# Altium footprint library Connector_PinHeader_1.27mm.PcbLib: 278 footprints (part 4 of 18)
Each footprint in its own frame and in the unit in brackets; x right, y up, seen from the top. Pads: shape width x height; smd on the part's side, far side on the other; paste and mask are expansions set on the pad; w line width, h text height; cw(c..) or ccw(c..) is an arc to the next point about the centre after c.
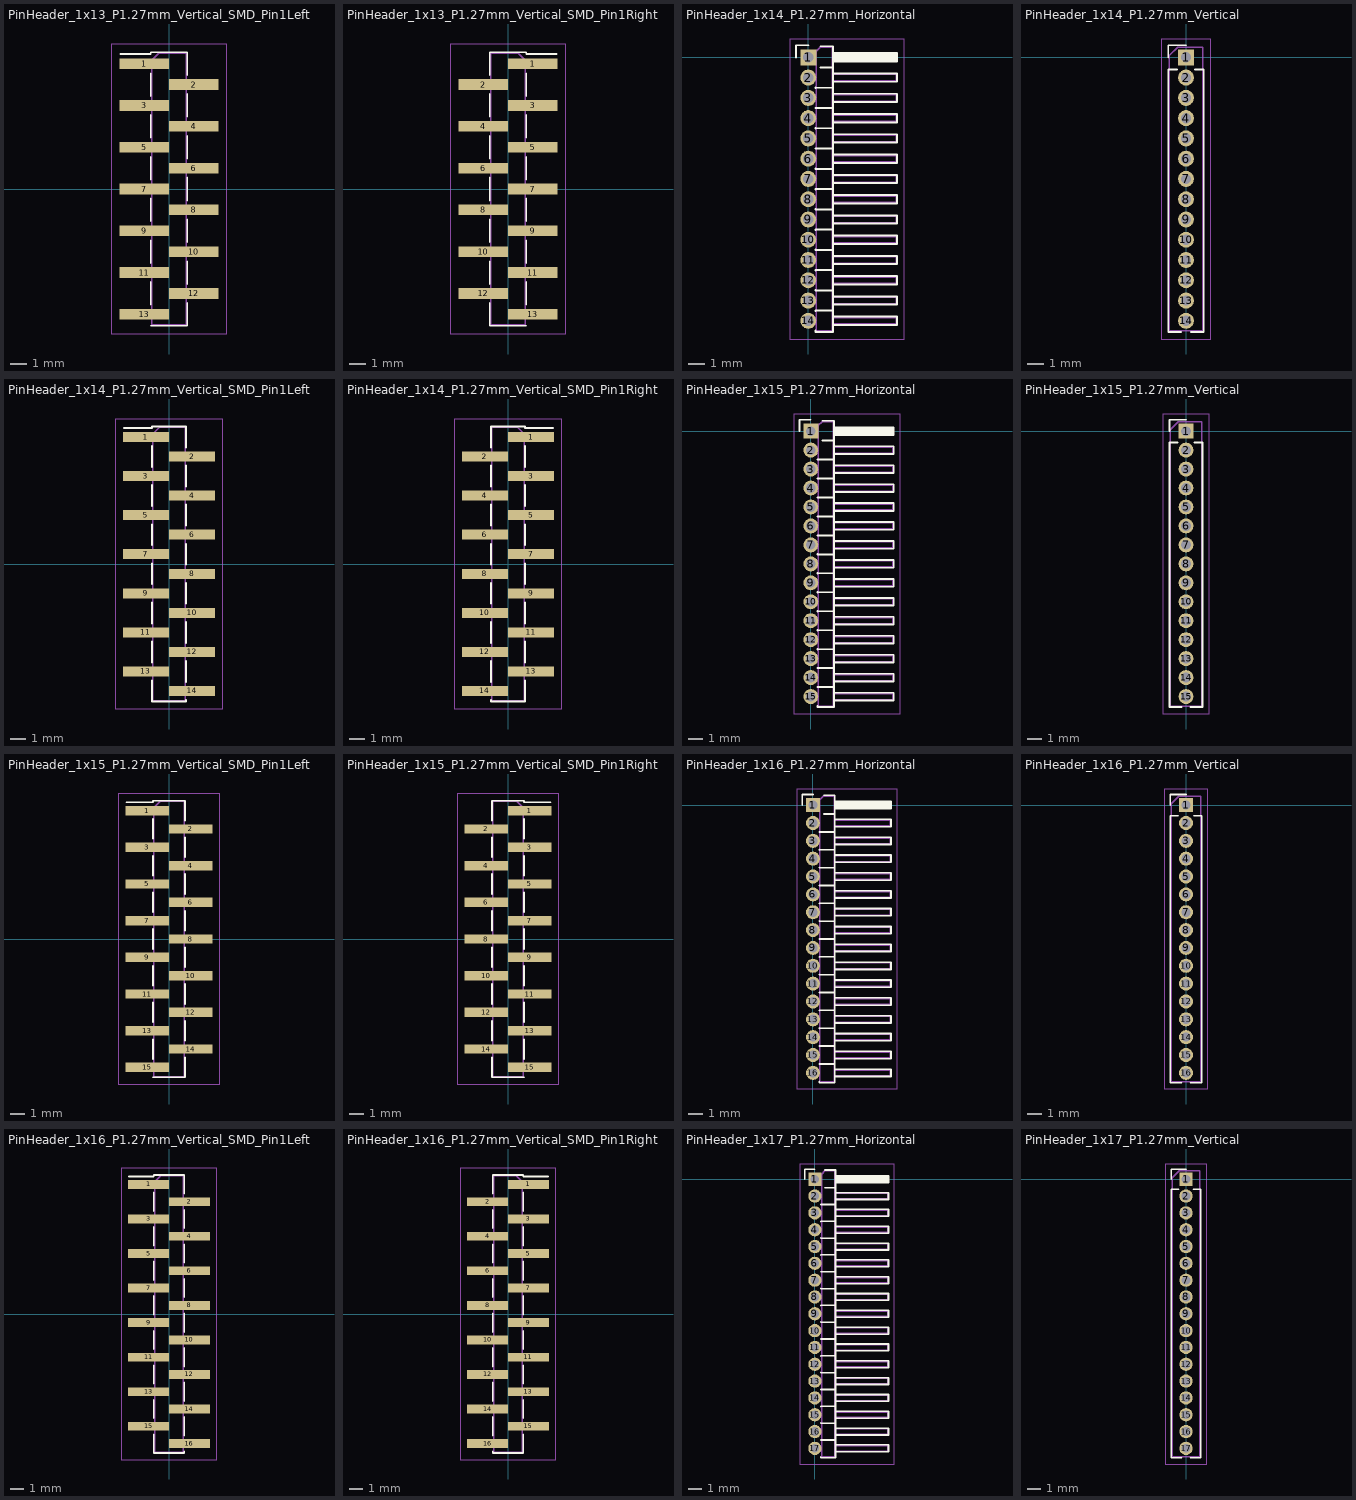
[diagram p3: the footprints below, top view; thin cyan lines are the x and y axes]

## PinHeader_1x13_P1.27mm_Vertical_SMD_Pin1Left [mm]
pads (13):
  rect 3x0.65 smd: 1(-1.5,7.62) 2(1.5,6.35) 3(-1.5,5.08) 4(1.5,3.81) 5(-1.5,2.54) 6(1.5,1.27) 7(-1.5,0) 8(1.5,-1.27) 9(-1.5,-2.54) 10(1.5,-3.81) 11(-1.5,-5.08) 12(1.5,-6.35) 13(-1.5,-7.62)
F.SilkS:
  lines w0.12: -2.94,8.205 -1.11,8.205 -1.11,8.315 1.11,8.315 ; -1.11,-8.315 1.11,-8.315 1.11,-8.205 ; -1.11,-7.035 -1.11,-5.665 ; -1.11,-4.495 -1.11,-3.125 ; -1.11,-1.955 -1.11,-0.585 ; -1.11,0.585 -1.11,1.955 ; -1.11,3.125 -1.11,4.495 ; -1.11,5.665 -1.11,7.035 ; 1.11,-8.305 1.11,-6.935 ; 1.11,-5.765 1.11,-4.395 ; 1.11,-3.225 1.11,-1.855 ; 1.11,-0.685 1.11,0.685 ; 1.11,1.855 1.11,3.225 ; 1.11,4.395 1.11,5.765 ; 1.11,6.935 1.11,8.305
F.CrtYd:
  lines w0.05: -3.5,-8.8 -3.5,8.8 3.5,8.8 3.5,-8.8 -3.5,-8.8
F.Fab:
  lines w0.1: -1.05,-7.82 -2.5,-7.82 -2.5,-7.42 -1.05,-7.42 ; -1.05,-5.28 -2.5,-5.28 -2.5,-4.88 -1.05,-4.88 ; -1.05,-2.74 -2.5,-2.74 -2.5,-2.34 -1.05,-2.34 ; -1.05,-0.2 -2.5,-0.2 -2.5,0.2 -1.05,0.2 ; -1.05,2.34 -2.5,2.34 -2.5,2.74 -1.05,2.74 ; -1.05,4.88 -2.5,4.88 -2.5,5.28 -1.05,5.28 ; -1.05,7.42 -2.5,7.42 -2.5,7.82 -1.05,7.82 ; 1.05,-6.55 2.5,-6.55 2.5,-6.15 1.05,-6.15 ; 1.05,-4.01 2.5,-4.01 2.5,-3.61 1.05,-3.61 ; 1.05,-1.47 2.5,-1.47 2.5,-1.07 1.05,-1.07 ; 1.05,1.07 2.5,1.07 2.5,1.47 1.05,1.47 ; 1.05,3.61 2.5,3.61 2.5,4.01 1.05,4.01 ; 1.05,6.15 2.5,6.15 2.5,6.55 1.05,6.55 ; -1.05,7.82 -1.05,-8.255 1.05,-8.255 1.05,8.255 -0.615,8.255 -1.05,7.82
  text "'.Designator'" at 0.84,-4.047 h1

## PinHeader_1x13_P1.27mm_Vertical_SMD_Pin1Right [mm]
pads (13):
  rect 3x0.65 smd: 1(1.5,7.62) 2(-1.5,6.35) 3(1.5,5.08) 4(-1.5,3.81) 5(1.5,2.54) 6(-1.5,1.27) 7(1.5,0) 8(-1.5,-1.27) 9(1.5,-2.54) 10(-1.5,-3.81) 11(1.5,-5.08) 12(-1.5,-6.35) 13(1.5,-7.62)
F.SilkS:
  lines w0.12: -1.11,-8.305 -1.11,-6.935 ; -1.11,-8.205 -1.11,-8.315 1.11,-8.315 ; -1.11,-5.765 -1.11,-4.395 ; -1.11,-3.225 -1.11,-1.855 ; -1.11,-0.685 -1.11,0.685 ; -1.11,1.855 -1.11,3.225 ; -1.11,4.395 -1.11,5.765 ; -1.11,6.935 -1.11,8.305 ; -1.11,8.315 1.11,8.315 1.11,8.205 2.94,8.205 ; 1.11,-7.035 1.11,-5.665 ; 1.11,-4.495 1.11,-3.125 ; 1.11,-1.955 1.11,-0.585 ; 1.11,0.585 1.11,1.955 ; 1.11,3.125 1.11,4.495 ; 1.11,5.665 1.11,7.035
F.CrtYd:
  lines w0.05: -3.5,-8.8 3.5,-8.8 3.5,8.8 -3.5,8.8 -3.5,-8.8
F.Fab:
  lines w0.1: -1.05,-6.55 -2.5,-6.55 -2.5,-6.15 -1.05,-6.15 ; -1.05,-4.01 -2.5,-4.01 -2.5,-3.61 -1.05,-3.61 ; -1.05,-1.47 -2.5,-1.47 -2.5,-1.07 -1.05,-1.07 ; -1.05,1.07 -2.5,1.07 -2.5,1.47 -1.05,1.47 ; -1.05,3.61 -2.5,3.61 -2.5,4.01 -1.05,4.01 ; -1.05,6.15 -2.5,6.15 -2.5,6.55 -1.05,6.55 ; 1.05,-7.82 2.5,-7.82 2.5,-7.42 1.05,-7.42 ; 1.05,-5.28 2.5,-5.28 2.5,-4.88 1.05,-4.88 ; 1.05,-2.74 2.5,-2.74 2.5,-2.34 1.05,-2.34 ; 1.05,-0.2 2.5,-0.2 2.5,0.2 1.05,0.2 ; 1.05,2.34 2.5,2.34 2.5,2.74 1.05,2.74 ; 1.05,4.88 2.5,4.88 2.5,5.28 1.05,5.28 ; 1.05,7.42 2.5,7.42 2.5,7.82 1.05,7.82 ; 1.05,7.82 1.05,-8.255 -1.05,-8.255 -1.05,8.255 0.615,8.255 1.05,7.82
  text "'.Designator'" at 0.84,-4.047 h1

## PinHeader_1x14_P1.27mm_Horizontal [mm]
pads (14):
  rect 1x1 hole 0.65: 1(0,0)
  rrect100% 1x1 hole 0.65: 2(0,-1.27) 3(0,-2.54) 4(0,-3.81) 5(0,-5.08) 6(0,-6.35) 7(0,-7.62) 8(0,-8.89) 9(0,-10.16) 10(0,-11.43) 11(0,-12.7) 12(0,-13.97) 13(0,-15.24) 14(0,-16.51)
F.SilkS:
  lines w0.12: -0.76,0 -0.76,0.76 0,0.76 ; 0.44,-17.13 0.44,-17.205 1.56,-17.205 1.56,0.695 0.76,0.695 ; 0.44,-15.89 0.44,-15.86 ; 0.44,-15.875 1.56,-15.875 ; 0.44,-14.62 0.44,-14.59 ; 0.44,-14.605 1.56,-14.605 ; 0.44,-13.35 0.44,-13.32 ; 0.44,-13.335 1.56,-13.335 ; 0.44,-12.08 0.44,-12.05 ; 0.44,-12.065 1.56,-12.065 ; 0.44,-10.81 0.44,-10.78 ; 0.44,-10.795 1.56,-10.795 ; 0.44,-9.54 0.44,-9.51 ; 0.44,-9.525 1.56,-9.525 ; 0.44,-8.27 0.44,-8.24 ; 0.44,-8.255 1.56,-8.255 ; 0.44,-7 0.44,-6.97 ; 0.44,-6.985 1.56,-6.985 ; 0.44,-5.73 0.44,-5.7 ; 0.44,-5.715 1.56,-5.715 ; 0.44,-4.46 0.44,-4.43 ; 0.44,-4.445 1.56,-4.445 ; 0.44,-3.19 0.44,-3.16 ; 0.44,-3.175 1.56,-3.175 ; 0.44,-1.92 0.44,-1.89 ; 0.44,-1.905 1.56,-1.905 ; 0.76,-0.635 1.56,-0.635 ; 1.56,-16.77 5.56,-16.77 5.56,-16.25 1.56,-16.25 ; 1.56,-15.5 5.56,-15.5 5.56,-14.98 1.56,-14.98 ; 1.56,-14.23 5.56,-14.23 5.56,-13.71 1.56,-13.71 ; 1.56,-12.96 5.56,-12.96 5.56,-12.44 1.56,-12.44 ; 1.56,-11.69 5.56,-11.69 5.56,-11.17 1.56,-11.17 ; 1.56,-10.42 5.56,-10.42 5.56,-9.9 1.56,-9.9 ; 1.56,-9.15 5.56,-9.15 5.56,-8.63 1.56,-8.63 ; 1.56,-7.88 5.56,-7.88 5.56,-7.36 1.56,-7.36 ; 1.56,-6.61 5.56,-6.61 5.56,-6.09 1.56,-6.09 ; 1.56,-5.34 5.56,-5.34 5.56,-4.82 1.56,-4.82 ; 1.56,-4.07 5.56,-4.07 5.56,-3.55 1.56,-3.55 ; 1.56,-2.8 5.56,-2.8 5.56,-2.28 1.56,-2.28 ; 1.56,-1.53 5.56,-1.53 5.56,-1.01 1.56,-1.01 ; 1.56,-0.26 5.56,-0.26 5.56,0.26 1.56,0.26 ; 1.56,-0.16 5.56,-0.16 ; 1.56,-0.04 5.56,-0.04 ; 1.56,0.08 5.56,0.08 ; 1.56,0.2 5.56,0.2
F.CrtYd:
  lines w0.05: -1.15,-17.65 -1.15,1.15 6,1.15 6,-17.65 -1.15,-17.65
F.Fab:
  lines w0.1: 0.5,-16.71 -0.2,-16.71 -0.2,-16.31 0.5,-16.31 ; 0.5,-15.44 -0.2,-15.44 -0.2,-15.04 0.5,-15.04 ; 0.5,-14.17 -0.2,-14.17 -0.2,-13.77 0.5,-13.77 ; 0.5,-12.9 -0.2,-12.9 -0.2,-12.5 0.5,-12.5 ; 0.5,-11.63 -0.2,-11.63 -0.2,-11.23 0.5,-11.23 ; 0.5,-10.36 -0.2,-10.36 -0.2,-9.96 0.5,-9.96 ; 0.5,-9.09 -0.2,-9.09 -0.2,-8.69 0.5,-8.69 ; 0.5,-7.82 -0.2,-7.82 -0.2,-7.42 0.5,-7.42 ; 0.5,-6.55 -0.2,-6.55 -0.2,-6.15 0.5,-6.15 ; 0.5,-5.28 -0.2,-5.28 -0.2,-4.88 0.5,-4.88 ; 0.5,-4.01 -0.2,-4.01 -0.2,-3.61 0.5,-3.61 ; 0.5,-2.74 -0.2,-2.74 -0.2,-2.34 0.5,-2.34 ; 0.5,-1.47 -0.2,-1.47 -0.2,-1.07 0.5,-1.07 ; 0.5,-0.2 -0.2,-0.2 -0.2,0.2 0.5,0.2 ; 1.5,-16.71 5.5,-16.71 5.5,-16.31 1.5,-16.31 ; 1.5,-15.44 5.5,-15.44 5.5,-15.04 1.5,-15.04 ; 1.5,-14.17 5.5,-14.17 5.5,-13.77 1.5,-13.77 ; 1.5,-12.9 5.5,-12.9 5.5,-12.5 1.5,-12.5 ; 1.5,-11.63 5.5,-11.63 5.5,-11.23 1.5,-11.23 ; 1.5,-10.36 5.5,-10.36 5.5,-9.96 1.5,-9.96 ; 1.5,-9.09 5.5,-9.09 5.5,-8.69 1.5,-8.69 ; 1.5,-7.82 5.5,-7.82 5.5,-7.42 1.5,-7.42 ; 1.5,-6.55 5.5,-6.55 5.5,-6.15 1.5,-6.15 ; 1.5,-5.28 5.5,-5.28 5.5,-4.88 1.5,-4.88 ; 1.5,-4.01 5.5,-4.01 5.5,-3.61 1.5,-3.61 ; 1.5,-2.74 5.5,-2.74 5.5,-2.34 1.5,-2.34 ; 1.5,-1.47 5.5,-1.47 5.5,-1.07 1.5,-1.07 ; 1.5,-0.2 5.5,-0.2 5.5,0.2 1.5,0.2 ; 0.5,-17.145 1.5,-17.145 1.5,0.635 0.75,0.635 0.5,0.385 0.5,-17.145
  text "'.Designator'" at 1.504,-10.683 h0.6

## PinHeader_1x14_P1.27mm_Vertical [mm]
pads (14):
  rect 1x1 hole 0.65: 1(0,0)
  rrect100% 1x1 hole 0.65: 2(0,-1.27) 3(0,-2.54) 4(0,-3.81) 5(0,-5.08) 6(0,-6.35) 7(0,-7.62) 8(0,-8.89) 9(0,-10.16) 10(0,-11.43) 11(0,-12.7) 12(0,-13.97) 13(0,-15.24) 14(0,-16.51)
F.SilkS:
  lines w0.12: -1.11,0 -1.11,0.76 0,0.76 ; -0.563,-0.76 -1.11,-0.76 -1.11,-17.205 -0.308,-17.205 ; 0.308,-17.205 1.11,-17.205 1.11,-0.76 0.563,-0.76
F.CrtYd:
  lines w0.05: -1.55,-17.65 1.55,-17.65 1.55,1.15 -1.55,1.15 -1.55,-17.65
F.Fab:
  lines w0.1: -1.05,-17.145 1.05,-17.145 1.05,0.635 -0.525,0.635 -1.05,0.11 -1.05,-17.145
  text "'.Designator'" at 0.84,-12.302 h1

## PinHeader_1x14_P1.27mm_Vertical_SMD_Pin1Left [mm]
pads (14):
  rect 3x0.65 smd: 1(-1.5,8.255) 2(1.5,6.985) 3(-1.5,5.715) 4(1.5,4.445) 5(-1.5,3.175) 6(1.5,1.905) 7(-1.5,0.635) 8(1.5,-0.635) 9(-1.5,-1.905) 10(1.5,-3.175) 11(-1.5,-4.445) 12(1.5,-5.715) 13(-1.5,-6.985) 14(1.5,-8.255)
F.SilkS:
  lines w0.12: -2.94,8.84 -1.11,8.84 -1.11,8.95 1.11,8.95 ; -1.11,-8.95 1.11,-8.95 1.11,-8.84 ; -1.11,-8.94 -1.11,-7.57 ; -1.11,-6.4 -1.11,-5.03 ; -1.11,-3.86 -1.11,-2.49 ; -1.11,-1.32 -1.11,0.05 ; -1.11,1.22 -1.11,2.59 ; -1.11,3.76 -1.11,5.13 ; -1.11,6.3 -1.11,7.67 ; 1.11,-7.67 1.11,-6.3 ; 1.11,-5.13 1.11,-3.76 ; 1.11,-2.59 1.11,-1.22 ; 1.11,-0.05 1.11,1.32 ; 1.11,2.49 1.11,3.86 ; 1.11,5.03 1.11,6.4 ; 1.11,7.57 1.11,8.94
F.CrtYd:
  lines w0.05: -3.5,-9.4 -3.5,9.4 3.5,9.4 3.5,-9.4 -3.5,-9.4
F.Fab:
  lines w0.1: -1.05,-7.185 -2.5,-7.185 -2.5,-6.785 -1.05,-6.785 ; -1.05,-4.645 -2.5,-4.645 -2.5,-4.245 -1.05,-4.245 ; -1.05,-2.105 -2.5,-2.105 -2.5,-1.705 -1.05,-1.705 ; -1.05,0.435 -2.5,0.435 -2.5,0.835 -1.05,0.835 ; -1.05,2.975 -2.5,2.975 -2.5,3.375 -1.05,3.375 ; -1.05,5.515 -2.5,5.515 -2.5,5.915 -1.05,5.915 ; -1.05,8.055 -2.5,8.055 -2.5,8.455 -1.05,8.455 ; 1.05,-8.455 2.5,-8.455 2.5,-8.055 1.05,-8.055 ; 1.05,-5.915 2.5,-5.915 2.5,-5.515 1.05,-5.515 ; 1.05,-3.375 2.5,-3.375 2.5,-2.975 1.05,-2.975 ; 1.05,-0.835 2.5,-0.835 2.5,-0.435 1.05,-0.435 ; 1.05,1.705 2.5,1.705 2.5,2.105 1.05,2.105 ; 1.05,4.245 2.5,4.245 2.5,4.645 1.05,4.645 ; 1.05,6.785 2.5,6.785 2.5,7.185 1.05,7.185 ; -1.05,8.455 -0.615,8.89 1.05,8.89 1.05,-8.89 -1.05,-8.89 -1.05,8.455
  text "'.Designator'" at 0.84,-4.047 h1

## PinHeader_1x14_P1.27mm_Vertical_SMD_Pin1Right [mm]
pads (14):
  rect 3x0.65 smd: 1(1.5,8.255) 2(-1.5,6.985) 3(1.5,5.715) 4(-1.5,4.445) 5(1.5,3.175) 6(-1.5,1.905) 7(1.5,0.635) 8(-1.5,-0.635) 9(1.5,-1.905) 10(-1.5,-3.175) 11(1.5,-4.445) 12(-1.5,-5.715) 13(1.5,-6.985) 14(-1.5,-8.255)
F.SilkS:
  lines w0.12: -1.11,-8.84 -1.11,-8.95 1.11,-8.95 ; -1.11,-7.67 -1.11,-6.3 ; -1.11,-5.13 -1.11,-3.76 ; -1.11,-2.59 -1.11,-1.22 ; -1.11,-0.05 -1.11,1.32 ; -1.11,2.49 -1.11,3.86 ; -1.11,5.03 -1.11,6.4 ; -1.11,7.57 -1.11,8.94 ; -1.11,8.95 1.11,8.95 1.11,8.84 2.94,8.84 ; 1.11,-8.94 1.11,-7.57 ; 1.11,-6.4 1.11,-5.03 ; 1.11,-3.86 1.11,-2.49 ; 1.11,-1.32 1.11,0.05 ; 1.11,1.22 1.11,2.59 ; 1.11,3.76 1.11,5.13 ; 1.11,6.3 1.11,7.67
F.CrtYd:
  lines w0.05: -3.5,-9.4 3.5,-9.4 3.5,9.4 -3.5,9.4 -3.5,-9.4
F.Fab:
  lines w0.1: -1.05,-8.455 -2.5,-8.455 -2.5,-8.055 -1.05,-8.055 ; -1.05,-5.915 -2.5,-5.915 -2.5,-5.515 -1.05,-5.515 ; -1.05,-3.375 -2.5,-3.375 -2.5,-2.975 -1.05,-2.975 ; -1.05,-0.835 -2.5,-0.835 -2.5,-0.435 -1.05,-0.435 ; -1.05,1.705 -2.5,1.705 -2.5,2.105 -1.05,2.105 ; -1.05,4.245 -2.5,4.245 -2.5,4.645 -1.05,4.645 ; -1.05,6.785 -2.5,6.785 -2.5,7.185 -1.05,7.185 ; 1.05,-7.185 2.5,-7.185 2.5,-6.785 1.05,-6.785 ; 1.05,-4.645 2.5,-4.645 2.5,-4.245 1.05,-4.245 ; 1.05,-2.105 2.5,-2.105 2.5,-1.705 1.05,-1.705 ; 1.05,0.435 2.5,0.435 2.5,0.835 1.05,0.835 ; 1.05,2.975 2.5,2.975 2.5,3.375 1.05,3.375 ; 1.05,5.515 2.5,5.515 2.5,5.915 1.05,5.915 ; 1.05,8.055 2.5,8.055 2.5,8.455 1.05,8.455 ; 1.05,8.455 1.05,-8.89 -1.05,-8.89 -1.05,8.89 0.615,8.89 1.05,8.455
  text "'.Designator'" at 0.84,-4.047 h1

## PinHeader_1x15_P1.27mm_Horizontal [mm]
pads (15):
  rect 1x1 hole 0.65: 1(0,0)
  rrect100% 1x1 hole 0.65: 2(0,-1.27) 3(0,-2.54) 4(0,-3.81) 5(0,-5.08) 6(0,-6.35) 7(0,-7.62) 8(0,-8.89) 9(0,-10.16) 10(0,-11.43) 11(0,-12.7) 12(0,-13.97) 13(0,-15.24) 14(0,-16.51) 15(0,-17.78)
F.SilkS:
  lines w0.12: -0.76,0 -0.76,0.76 0,0.76 ; 0.44,-18.4 0.44,-18.475 1.56,-18.475 1.56,0.695 0.76,0.695 ; 0.44,-17.16 0.44,-17.13 ; 0.44,-17.145 1.56,-17.145 ; 0.44,-15.89 0.44,-15.86 ; 0.44,-15.875 1.56,-15.875 ; 0.44,-14.62 0.44,-14.59 ; 0.44,-14.605 1.56,-14.605 ; 0.44,-13.35 0.44,-13.32 ; 0.44,-13.335 1.56,-13.335 ; 0.44,-12.08 0.44,-12.05 ; 0.44,-12.065 1.56,-12.065 ; 0.44,-10.81 0.44,-10.78 ; 0.44,-10.795 1.56,-10.795 ; 0.44,-9.54 0.44,-9.51 ; 0.44,-9.525 1.56,-9.525 ; 0.44,-8.27 0.44,-8.24 ; 0.44,-8.255 1.56,-8.255 ; 0.44,-7 0.44,-6.97 ; 0.44,-6.985 1.56,-6.985 ; 0.44,-5.73 0.44,-5.7 ; 0.44,-5.715 1.56,-5.715 ; 0.44,-4.46 0.44,-4.43 ; 0.44,-4.445 1.56,-4.445 ; 0.44,-3.19 0.44,-3.16 ; 0.44,-3.175 1.56,-3.175 ; 0.44,-1.92 0.44,-1.89 ; 0.44,-1.905 1.56,-1.905 ; 0.76,-0.635 1.56,-0.635 ; 1.56,-18.04 5.56,-18.04 5.56,-17.52 1.56,-17.52 ; 1.56,-16.77 5.56,-16.77 5.56,-16.25 1.56,-16.25 ; 1.56,-15.5 5.56,-15.5 5.56,-14.98 1.56,-14.98 ; 1.56,-14.23 5.56,-14.23 5.56,-13.71 1.56,-13.71 ; 1.56,-12.96 5.56,-12.96 5.56,-12.44 1.56,-12.44 ; 1.56,-11.69 5.56,-11.69 5.56,-11.17 1.56,-11.17 ; 1.56,-10.42 5.56,-10.42 5.56,-9.9 1.56,-9.9 ; 1.56,-9.15 5.56,-9.15 5.56,-8.63 1.56,-8.63 ; 1.56,-7.88 5.56,-7.88 5.56,-7.36 1.56,-7.36 ; 1.56,-6.61 5.56,-6.61 5.56,-6.09 1.56,-6.09 ; 1.56,-5.34 5.56,-5.34 5.56,-4.82 1.56,-4.82 ; 1.56,-4.07 5.56,-4.07 5.56,-3.55 1.56,-3.55 ; 1.56,-2.8 5.56,-2.8 5.56,-2.28 1.56,-2.28 ; 1.56,-1.53 5.56,-1.53 5.56,-1.01 1.56,-1.01 ; 1.56,-0.26 5.56,-0.26 5.56,0.26 1.56,0.26 ; 1.56,-0.16 5.56,-0.16 ; 1.56,-0.04 5.56,-0.04 ; 1.56,0.08 5.56,0.08 ; 1.56,0.2 5.56,0.2
F.CrtYd:
  lines w0.05: -1.15,-18.95 -1.15,1.15 6,1.15 6,-18.95 -1.15,-18.95
F.Fab:
  lines w0.1: 0.5,-17.98 -0.2,-17.98 -0.2,-17.58 0.5,-17.58 ; 0.5,-16.71 -0.2,-16.71 -0.2,-16.31 0.5,-16.31 ; 0.5,-15.44 -0.2,-15.44 -0.2,-15.04 0.5,-15.04 ; 0.5,-14.17 -0.2,-14.17 -0.2,-13.77 0.5,-13.77 ; 0.5,-12.9 -0.2,-12.9 -0.2,-12.5 0.5,-12.5 ; 0.5,-11.63 -0.2,-11.63 -0.2,-11.23 0.5,-11.23 ; 0.5,-10.36 -0.2,-10.36 -0.2,-9.96 0.5,-9.96 ; 0.5,-9.09 -0.2,-9.09 -0.2,-8.69 0.5,-8.69 ; 0.5,-7.82 -0.2,-7.82 -0.2,-7.42 0.5,-7.42 ; 0.5,-6.55 -0.2,-6.55 -0.2,-6.15 0.5,-6.15 ; 0.5,-5.28 -0.2,-5.28 -0.2,-4.88 0.5,-4.88 ; 0.5,-4.01 -0.2,-4.01 -0.2,-3.61 0.5,-3.61 ; 0.5,-2.74 -0.2,-2.74 -0.2,-2.34 0.5,-2.34 ; 0.5,-1.47 -0.2,-1.47 -0.2,-1.07 0.5,-1.07 ; 0.5,-0.2 -0.2,-0.2 -0.2,0.2 0.5,0.2 ; 1.5,-17.98 5.5,-17.98 5.5,-17.58 1.5,-17.58 ; 1.5,-16.71 5.5,-16.71 5.5,-16.31 1.5,-16.31 ; 1.5,-15.44 5.5,-15.44 5.5,-15.04 1.5,-15.04 ; 1.5,-14.17 5.5,-14.17 5.5,-13.77 1.5,-13.77 ; 1.5,-12.9 5.5,-12.9 5.5,-12.5 1.5,-12.5 ; 1.5,-11.63 5.5,-11.63 5.5,-11.23 1.5,-11.23 ; 1.5,-10.36 5.5,-10.36 5.5,-9.96 1.5,-9.96 ; 1.5,-9.09 5.5,-9.09 5.5,-8.69 1.5,-8.69 ; 1.5,-7.82 5.5,-7.82 5.5,-7.42 1.5,-7.42 ; 1.5,-6.55 5.5,-6.55 5.5,-6.15 1.5,-6.15 ; 1.5,-5.28 5.5,-5.28 5.5,-4.88 1.5,-4.88 ; 1.5,-4.01 5.5,-4.01 5.5,-3.61 1.5,-3.61 ; 1.5,-2.74 5.5,-2.74 5.5,-2.34 1.5,-2.34 ; 1.5,-1.47 5.5,-1.47 5.5,-1.07 1.5,-1.07 ; 1.5,-0.2 5.5,-0.2 5.5,0.2 1.5,0.2 ; 0.5,-18.415 0.5,0.385 0.75,0.635 1.5,0.635 1.5,-18.415 0.5,-18.415
  text "'.Designator'" at 1.504,-11.318 h0.6

## PinHeader_1x15_P1.27mm_Vertical [mm]
pads (15):
  rect 1x1 hole 0.65: 1(0,0)
  rrect100% 1x1 hole 0.65: 2(0,-1.27) 3(0,-2.54) 4(0,-3.81) 5(0,-5.08) 6(0,-6.35) 7(0,-7.62) 8(0,-8.89) 9(0,-10.16) 10(0,-11.43) 11(0,-12.7) 12(0,-13.97) 13(0,-15.24) 14(0,-16.51) 15(0,-17.78)
F.SilkS:
  lines w0.12: -1.11,0 -1.11,0.76 0,0.76 ; -0.563,-0.76 -1.11,-0.76 -1.11,-18.475 -0.308,-18.475 ; 0.308,-18.475 1.11,-18.475 1.11,-0.76 0.563,-0.76
F.CrtYd:
  lines w0.05: -1.55,-18.95 -1.55,1.15 1.55,1.15 1.55,-18.95 -1.55,-18.95
F.Fab:
  lines w0.1: -1.05,-18.415 -1.05,0.11 -0.525,0.635 1.05,0.635 1.05,-18.415 -1.05,-18.415
  text "'.Designator'" at 0.84,-12.937 h1

## PinHeader_1x15_P1.27mm_Vertical_SMD_Pin1Left [mm]
pads (15):
  rect 3x0.65 smd: 1(-1.5,8.89) 2(1.5,7.62) 3(-1.5,6.35) 4(1.5,5.08) 5(-1.5,3.81) 6(1.5,2.54) 7(-1.5,1.27) 8(1.5,0) 9(-1.5,-1.27) 10(1.5,-2.54) 11(-1.5,-3.81) 12(1.5,-5.08) 13(-1.5,-6.35) 14(1.5,-7.62) 15(-1.5,-8.89)
F.SilkS:
  lines w0.12: -2.94,9.475 -1.11,9.475 -1.11,9.585 1.11,9.585 ; -1.11,-9.585 1.11,-9.585 1.11,-9.475 ; -1.11,-8.305 -1.11,-6.935 ; -1.11,-5.765 -1.11,-4.395 ; -1.11,-3.225 -1.11,-1.855 ; -1.11,-0.685 -1.11,0.685 ; -1.11,1.855 -1.11,3.225 ; -1.11,4.395 -1.11,5.765 ; -1.11,6.935 -1.11,8.305 ; 1.11,-9.575 1.11,-8.205 ; 1.11,-7.035 1.11,-5.665 ; 1.11,-4.495 1.11,-3.125 ; 1.11,-1.955 1.11,-0.585 ; 1.11,0.585 1.11,1.955 ; 1.11,3.125 1.11,4.495 ; 1.11,5.665 1.11,7.035 ; 1.11,8.205 1.11,9.575
F.CrtYd:
  lines w0.05: -3.5,-10.05 3.5,-10.05 3.5,10.05 -3.5,10.05 -3.5,-10.05
F.Fab:
  lines w0.1: -1.05,-9.09 -2.5,-9.09 -2.5,-8.69 -1.05,-8.69 ; -1.05,-6.55 -2.5,-6.55 -2.5,-6.15 -1.05,-6.15 ; -1.05,-4.01 -2.5,-4.01 -2.5,-3.61 -1.05,-3.61 ; -1.05,-1.47 -2.5,-1.47 -2.5,-1.07 -1.05,-1.07 ; -1.05,1.07 -2.5,1.07 -2.5,1.47 -1.05,1.47 ; -1.05,3.61 -2.5,3.61 -2.5,4.01 -1.05,4.01 ; -1.05,6.15 -2.5,6.15 -2.5,6.55 -1.05,6.55 ; -1.05,8.69 -2.5,8.69 -2.5,9.09 -1.05,9.09 ; 1.05,-7.82 2.5,-7.82 2.5,-7.42 1.05,-7.42 ; 1.05,-5.28 2.5,-5.28 2.5,-4.88 1.05,-4.88 ; 1.05,-2.74 2.5,-2.74 2.5,-2.34 1.05,-2.34 ; 1.05,-0.2 2.5,-0.2 2.5,0.2 1.05,0.2 ; 1.05,2.34 2.5,2.34 2.5,2.74 1.05,2.74 ; 1.05,4.88 2.5,4.88 2.5,5.28 1.05,5.28 ; 1.05,7.42 2.5,7.42 2.5,7.82 1.05,7.82 ; -1.05,9.09 -0.615,9.525 1.05,9.525 1.05,-9.525 -1.05,-9.525 -1.05,9.09
  text "'.Designator'" at 0.84,-4.047 h1

## PinHeader_1x15_P1.27mm_Vertical_SMD_Pin1Right [mm]
pads (15):
  rect 3x0.65 smd: 1(1.5,8.89) 2(-1.5,7.62) 3(1.5,6.35) 4(-1.5,5.08) 5(1.5,3.81) 6(-1.5,2.54) 7(1.5,1.27) 8(-1.5,0) 9(1.5,-1.27) 10(-1.5,-2.54) 11(1.5,-3.81) 12(-1.5,-5.08) 13(1.5,-6.35) 14(-1.5,-7.62) 15(1.5,-8.89)
F.SilkS:
  lines w0.12: -1.11,-9.575 -1.11,-8.205 ; -1.11,-9.475 -1.11,-9.585 1.11,-9.585 ; -1.11,-7.035 -1.11,-5.665 ; -1.11,-4.495 -1.11,-3.125 ; -1.11,-1.955 -1.11,-0.585 ; -1.11,0.585 -1.11,1.955 ; -1.11,3.125 -1.11,4.495 ; -1.11,5.665 -1.11,7.035 ; -1.11,8.205 -1.11,9.575 ; -1.11,9.585 1.11,9.585 1.11,9.475 2.94,9.475 ; 1.11,-8.305 1.11,-6.935 ; 1.11,-5.765 1.11,-4.395 ; 1.11,-3.225 1.11,-1.855 ; 1.11,-0.685 1.11,0.685 ; 1.11,1.855 1.11,3.225 ; 1.11,4.395 1.11,5.765 ; 1.11,6.935 1.11,8.305
F.CrtYd:
  lines w0.05: -3.5,-10.05 -3.5,10.05 3.5,10.05 3.5,-10.05 -3.5,-10.05
F.Fab:
  lines w0.1: -1.05,-7.82 -2.5,-7.82 -2.5,-7.42 -1.05,-7.42 ; -1.05,-5.28 -2.5,-5.28 -2.5,-4.88 -1.05,-4.88 ; -1.05,-2.74 -2.5,-2.74 -2.5,-2.34 -1.05,-2.34 ; -1.05,-0.2 -2.5,-0.2 -2.5,0.2 -1.05,0.2 ; -1.05,2.34 -2.5,2.34 -2.5,2.74 -1.05,2.74 ; -1.05,4.88 -2.5,4.88 -2.5,5.28 -1.05,5.28 ; -1.05,7.42 -2.5,7.42 -2.5,7.82 -1.05,7.82 ; 1.05,-9.09 2.5,-9.09 2.5,-8.69 1.05,-8.69 ; 1.05,-6.55 2.5,-6.55 2.5,-6.15 1.05,-6.15 ; 1.05,-4.01 2.5,-4.01 2.5,-3.61 1.05,-3.61 ; 1.05,-1.47 2.5,-1.47 2.5,-1.07 1.05,-1.07 ; 1.05,1.07 2.5,1.07 2.5,1.47 1.05,1.47 ; 1.05,3.61 2.5,3.61 2.5,4.01 1.05,4.01 ; 1.05,6.15 2.5,6.15 2.5,6.55 1.05,6.55 ; 1.05,8.69 2.5,8.69 2.5,9.09 1.05,9.09 ; 1.05,9.09 0.615,9.525 -1.05,9.525 -1.05,-9.525 1.05,-9.525 1.05,9.09
  text "'.Designator'" at 0.84,-4.047 h1

## PinHeader_1x16_P1.27mm_Horizontal [mm]
pads (16):
  rect 1x1 hole 0.65: 1(0,0)
  rrect100% 1x1 hole 0.65: 2(0,-1.27) 3(0,-2.54) 4(0,-3.81) 5(0,-5.08) 6(0,-6.35) 7(0,-7.62) 8(0,-8.89) 9(0,-10.16) 10(0,-11.43) 11(0,-12.7) 12(0,-13.97) 13(0,-15.24) 14(0,-16.51) 15(0,-17.78) 16(0,-19.05)
F.SilkS:
  lines w0.12: -0.76,0 -0.76,0.76 0,0.76 ; 0.44,-19.67 0.44,-19.745 1.56,-19.745 1.56,0.695 0.76,0.695 ; 0.44,-18.43 0.44,-18.4 ; 0.44,-18.415 1.56,-18.415 ; 0.44,-17.16 0.44,-17.13 ; 0.44,-17.145 1.56,-17.145 ; 0.44,-15.89 0.44,-15.86 ; 0.44,-15.875 1.56,-15.875 ; 0.44,-14.62 0.44,-14.59 ; 0.44,-14.605 1.56,-14.605 ; 0.44,-13.35 0.44,-13.32 ; 0.44,-13.335 1.56,-13.335 ; 0.44,-12.08 0.44,-12.05 ; 0.44,-12.065 1.56,-12.065 ; 0.44,-10.81 0.44,-10.78 ; 0.44,-10.795 1.56,-10.795 ; 0.44,-9.54 0.44,-9.51 ; 0.44,-9.525 1.56,-9.525 ; 0.44,-8.27 0.44,-8.24 ; 0.44,-8.255 1.56,-8.255 ; 0.44,-7 0.44,-6.97 ; 0.44,-6.985 1.56,-6.985 ; 0.44,-5.73 0.44,-5.7 ; 0.44,-5.715 1.56,-5.715 ; 0.44,-4.46 0.44,-4.43 ; 0.44,-4.445 1.56,-4.445 ; 0.44,-3.19 0.44,-3.16 ; 0.44,-3.175 1.56,-3.175 ; 0.44,-1.92 0.44,-1.89 ; 0.44,-1.905 1.56,-1.905 ; 0.76,-0.635 1.56,-0.635 ; 1.56,-19.31 5.56,-19.31 5.56,-18.79 1.56,-18.79 ; 1.56,-18.04 5.56,-18.04 5.56,-17.52 1.56,-17.52 ; 1.56,-16.77 5.56,-16.77 5.56,-16.25 1.56,-16.25 ; 1.56,-15.5 5.56,-15.5 5.56,-14.98 1.56,-14.98 ; 1.56,-14.23 5.56,-14.23 5.56,-13.71 1.56,-13.71 ; 1.56,-12.96 5.56,-12.96 5.56,-12.44 1.56,-12.44 ; 1.56,-11.69 5.56,-11.69 5.56,-11.17 1.56,-11.17 ; 1.56,-10.42 5.56,-10.42 5.56,-9.9 1.56,-9.9 ; 1.56,-9.15 5.56,-9.15 5.56,-8.63 1.56,-8.63 ; 1.56,-7.88 5.56,-7.88 5.56,-7.36 1.56,-7.36 ; 1.56,-6.61 5.56,-6.61 5.56,-6.09 1.56,-6.09 ; 1.56,-5.34 5.56,-5.34 5.56,-4.82 1.56,-4.82 ; 1.56,-4.07 5.56,-4.07 5.56,-3.55 1.56,-3.55 ; 1.56,-2.8 5.56,-2.8 5.56,-2.28 1.56,-2.28 ; 1.56,-1.53 5.56,-1.53 5.56,-1.01 1.56,-1.01 ; 1.56,-0.26 5.56,-0.26 5.56,0.26 1.56,0.26 ; 1.56,-0.16 5.56,-0.16 ; 1.56,-0.04 5.56,-0.04 ; 1.56,0.08 5.56,0.08 ; 1.56,0.2 5.56,0.2
F.CrtYd:
  lines w0.05: -1.15,-20.2 6,-20.2 6,1.15 -1.15,1.15 -1.15,-20.2
F.Fab:
  lines w0.1: 0.5,-19.25 -0.2,-19.25 -0.2,-18.85 0.5,-18.85 ; 0.5,-17.98 -0.2,-17.98 -0.2,-17.58 0.5,-17.58 ; 0.5,-16.71 -0.2,-16.71 -0.2,-16.31 0.5,-16.31 ; 0.5,-15.44 -0.2,-15.44 -0.2,-15.04 0.5,-15.04 ; 0.5,-14.17 -0.2,-14.17 -0.2,-13.77 0.5,-13.77 ; 0.5,-12.9 -0.2,-12.9 -0.2,-12.5 0.5,-12.5 ; 0.5,-11.63 -0.2,-11.63 -0.2,-11.23 0.5,-11.23 ; 0.5,-10.36 -0.2,-10.36 -0.2,-9.96 0.5,-9.96 ; 0.5,-9.09 -0.2,-9.09 -0.2,-8.69 0.5,-8.69 ; 0.5,-7.82 -0.2,-7.82 -0.2,-7.42 0.5,-7.42 ; 0.5,-6.55 -0.2,-6.55 -0.2,-6.15 0.5,-6.15 ; 0.5,-5.28 -0.2,-5.28 -0.2,-4.88 0.5,-4.88 ; 0.5,-4.01 -0.2,-4.01 -0.2,-3.61 0.5,-3.61 ; 0.5,-2.74 -0.2,-2.74 -0.2,-2.34 0.5,-2.34 ; 0.5,-1.47 -0.2,-1.47 -0.2,-1.07 0.5,-1.07 ; 0.5,-0.2 -0.2,-0.2 -0.2,0.2 0.5,0.2 ; 1.5,-19.25 5.5,-19.25 5.5,-18.85 1.5,-18.85 ; 1.5,-17.98 5.5,-17.98 5.5,-17.58 1.5,-17.58 ; 1.5,-16.71 5.5,-16.71 5.5,-16.31 1.5,-16.31 ; 1.5,-15.44 5.5,-15.44 5.5,-15.04 1.5,-15.04 ; 1.5,-14.17 5.5,-14.17 5.5,-13.77 1.5,-13.77 ; 1.5,-12.9 5.5,-12.9 5.5,-12.5 1.5,-12.5 ; 1.5,-11.63 5.5,-11.63 5.5,-11.23 1.5,-11.23 ; 1.5,-10.36 5.5,-10.36 5.5,-9.96 1.5,-9.96 ; 1.5,-9.09 5.5,-9.09 5.5,-8.69 1.5,-8.69 ; 1.5,-7.82 5.5,-7.82 5.5,-7.42 1.5,-7.42 ; 1.5,-6.55 5.5,-6.55 5.5,-6.15 1.5,-6.15 ; 1.5,-5.28 5.5,-5.28 5.5,-4.88 1.5,-4.88 ; 1.5,-4.01 5.5,-4.01 5.5,-3.61 1.5,-3.61 ; 1.5,-2.74 5.5,-2.74 5.5,-2.34 1.5,-2.34 ; 1.5,-1.47 5.5,-1.47 5.5,-1.07 1.5,-1.07 ; 1.5,-0.2 5.5,-0.2 5.5,0.2 1.5,0.2 ; 0.5,-19.685 0.5,0.385 0.75,0.635 1.5,0.635 1.5,-19.685 0.5,-19.685
  text "'.Designator'" at 1.504,-11.953 h0.6

## PinHeader_1x16_P1.27mm_Vertical [mm]
pads (16):
  rect 1x1 hole 0.65: 1(0,0)
  rrect100% 1x1 hole 0.65: 2(0,-1.27) 3(0,-2.54) 4(0,-3.81) 5(0,-5.08) 6(0,-6.35) 7(0,-7.62) 8(0,-8.89) 9(0,-10.16) 10(0,-11.43) 11(0,-12.7) 12(0,-13.97) 13(0,-15.24) 14(0,-16.51) 15(0,-17.78) 16(0,-19.05)
F.SilkS:
  lines w0.12: -1.11,0 -1.11,0.76 0,0.76 ; -0.563,-0.76 -1.11,-0.76 -1.11,-19.745 -0.308,-19.745 ; 0.308,-19.745 1.11,-19.745 1.11,-0.76 0.563,-0.76
F.CrtYd:
  lines w0.05: -1.55,-20.2 1.55,-20.2 1.55,1.15 -1.55,1.15 -1.55,-20.2
F.Fab:
  lines w0.1: -1.05,-19.685 1.05,-19.685 1.05,0.635 -0.525,0.635 -1.05,0.11 -1.05,-19.685
  text "'.Designator'" at 0.84,-13.572 h1

## PinHeader_1x16_P1.27mm_Vertical_SMD_Pin1Left [mm]
pads (16):
  rect 3x0.65 smd: 1(-1.5,9.525) 2(1.5,8.255) 3(-1.5,6.985) 4(1.5,5.715) 5(-1.5,4.445) 6(1.5,3.175) 7(-1.5,1.905) 8(1.5,0.635) 9(-1.5,-0.635) 10(1.5,-1.905) 11(-1.5,-3.175) 12(1.5,-4.445) 13(-1.5,-5.715) 14(1.5,-6.985) 15(-1.5,-8.255) 16(1.5,-9.525)
F.SilkS:
  lines w0.12: -2.94,10.11 -1.11,10.11 -1.11,10.22 1.11,10.22 ; -1.11,-10.22 1.11,-10.22 1.11,-10.11 ; -1.11,-10.21 -1.11,-8.84 ; -1.11,-7.67 -1.11,-6.3 ; -1.11,-5.13 -1.11,-3.76 ; -1.11,-2.59 -1.11,-1.22 ; -1.11,-0.05 -1.11,1.32 ; -1.11,2.49 -1.11,3.86 ; -1.11,5.03 -1.11,6.4 ; -1.11,7.57 -1.11,8.94 ; 1.11,-8.94 1.11,-7.57 ; 1.11,-6.4 1.11,-5.03 ; 1.11,-3.86 1.11,-2.49 ; 1.11,-1.32 1.11,0.05 ; 1.11,1.22 1.11,2.59 ; 1.11,3.76 1.11,5.13 ; 1.11,6.3 1.11,7.67 ; 1.11,8.84 1.11,10.21
F.CrtYd:
  lines w0.05: -3.5,-10.7 3.5,-10.7 3.5,10.7 -3.5,10.7 -3.5,-10.7
F.Fab:
  lines w0.1: -1.05,-8.455 -2.5,-8.455 -2.5,-8.055 -1.05,-8.055 ; -1.05,-5.915 -2.5,-5.915 -2.5,-5.515 -1.05,-5.515 ; -1.05,-3.375 -2.5,-3.375 -2.5,-2.975 -1.05,-2.975 ; -1.05,-0.835 -2.5,-0.835 -2.5,-0.435 -1.05,-0.435 ; -1.05,1.705 -2.5,1.705 -2.5,2.105 -1.05,2.105 ; -1.05,4.245 -2.5,4.245 -2.5,4.645 -1.05,4.645 ; -1.05,6.785 -2.5,6.785 -2.5,7.185 -1.05,7.185 ; -1.05,9.325 -2.5,9.325 -2.5,9.725 -1.05,9.725 ; 1.05,-9.725 2.5,-9.725 2.5,-9.325 1.05,-9.325 ; 1.05,-7.185 2.5,-7.185 2.5,-6.785 1.05,-6.785 ; 1.05,-4.645 2.5,-4.645 2.5,-4.245 1.05,-4.245 ; 1.05,-2.105 2.5,-2.105 2.5,-1.705 1.05,-1.705 ; 1.05,0.435 2.5,0.435 2.5,0.835 1.05,0.835 ; 1.05,2.975 2.5,2.975 2.5,3.375 1.05,3.375 ; 1.05,5.515 2.5,5.515 2.5,5.915 1.05,5.915 ; 1.05,8.055 2.5,8.055 2.5,8.455 1.05,8.455 ; -1.05,9.725 -0.615,10.16 1.05,10.16 1.05,-10.16 -1.05,-10.16 -1.05,9.725
  text "'.Designator'" at 0.84,-4.047 h1

## PinHeader_1x16_P1.27mm_Vertical_SMD_Pin1Right [mm]
pads (16):
  rect 3x0.65 smd: 1(1.5,9.525) 2(-1.5,8.255) 3(1.5,6.985) 4(-1.5,5.715) 5(1.5,4.445) 6(-1.5,3.175) 7(1.5,1.905) 8(-1.5,0.635) 9(1.5,-0.635) 10(-1.5,-1.905) 11(1.5,-3.175) 12(-1.5,-4.445) 13(1.5,-5.715) 14(-1.5,-6.985) 15(1.5,-8.255) 16(-1.5,-9.525)
F.SilkS:
  lines w0.12: -1.11,-10.11 -1.11,-10.22 1.11,-10.22 ; -1.11,-8.94 -1.11,-7.57 ; -1.11,-6.4 -1.11,-5.03 ; -1.11,-3.86 -1.11,-2.49 ; -1.11,-1.32 -1.11,0.05 ; -1.11,1.22 -1.11,2.59 ; -1.11,3.76 -1.11,5.13 ; -1.11,6.3 -1.11,7.67 ; -1.11,8.84 -1.11,10.21 ; -1.11,10.22 1.11,10.22 1.11,10.11 2.94,10.11 ; 1.11,-10.21 1.11,-8.84 ; 1.11,-7.67 1.11,-6.3 ; 1.11,-5.13 1.11,-3.76 ; 1.11,-2.59 1.11,-1.22 ; 1.11,-0.05 1.11,1.32 ; 1.11,2.49 1.11,3.86 ; 1.11,5.03 1.11,6.4 ; 1.11,7.57 1.11,8.94
F.CrtYd:
  lines w0.05: -3.5,-10.7 3.5,-10.7 3.5,10.7 -3.5,10.7 -3.5,-10.7
F.Fab:
  lines w0.1: -1.05,-9.725 -2.5,-9.725 -2.5,-9.325 -1.05,-9.325 ; -1.05,-7.185 -2.5,-7.185 -2.5,-6.785 -1.05,-6.785 ; -1.05,-4.645 -2.5,-4.645 -2.5,-4.245 -1.05,-4.245 ; -1.05,-2.105 -2.5,-2.105 -2.5,-1.705 -1.05,-1.705 ; -1.05,0.435 -2.5,0.435 -2.5,0.835 -1.05,0.835 ; -1.05,2.975 -2.5,2.975 -2.5,3.375 -1.05,3.375 ; -1.05,5.515 -2.5,5.515 -2.5,5.915 -1.05,5.915 ; -1.05,8.055 -2.5,8.055 -2.5,8.455 -1.05,8.455 ; 1.05,-8.455 2.5,-8.455 2.5,-8.055 1.05,-8.055 ; 1.05,-5.915 2.5,-5.915 2.5,-5.515 1.05,-5.515 ; 1.05,-3.375 2.5,-3.375 2.5,-2.975 1.05,-2.975 ; 1.05,-0.835 2.5,-0.835 2.5,-0.435 1.05,-0.435 ; 1.05,1.705 2.5,1.705 2.5,2.105 1.05,2.105 ; 1.05,4.245 2.5,4.245 2.5,4.645 1.05,4.645 ; 1.05,6.785 2.5,6.785 2.5,7.185 1.05,7.185 ; 1.05,9.325 2.5,9.325 2.5,9.725 1.05,9.725 ; 1.05,9.725 1.05,-10.16 -1.05,-10.16 -1.05,10.16 0.615,10.16 1.05,9.725
  text "'.Designator'" at 0.84,-4.047 h1

## PinHeader_1x17_P1.27mm_Horizontal [mm]
pads (17):
  rect 1x1 hole 0.65: 1(0,0)
  rrect100% 1x1 hole 0.65: 2(0,-1.27) 3(0,-2.54) 4(0,-3.81) 5(0,-5.08) 6(0,-6.35) 7(0,-7.62) 8(0,-8.89) 9(0,-10.16) 10(0,-11.43) 11(0,-12.7) 12(0,-13.97) 13(0,-15.24) 14(0,-16.51) 15(0,-17.78) 16(0,-19.05) 17(0,-20.32)
F.SilkS:
  lines w0.12: -0.76,0 -0.76,0.76 0,0.76 ; 0.44,-20.94 0.44,-21.015 1.56,-21.015 1.56,0.695 0.76,0.695 ; 0.44,-19.7 0.44,-19.67 ; 0.44,-19.685 1.56,-19.685 ; 0.44,-18.43 0.44,-18.4 ; 0.44,-18.415 1.56,-18.415 ; 0.44,-17.16 0.44,-17.13 ; 0.44,-17.145 1.56,-17.145 ; 0.44,-15.89 0.44,-15.86 ; 0.44,-15.875 1.56,-15.875 ; 0.44,-14.62 0.44,-14.59 ; 0.44,-14.605 1.56,-14.605 ; 0.44,-13.35 0.44,-13.32 ; 0.44,-13.335 1.56,-13.335 ; 0.44,-12.08 0.44,-12.05 ; 0.44,-12.065 1.56,-12.065 ; 0.44,-10.81 0.44,-10.78 ; 0.44,-10.795 1.56,-10.795 ; 0.44,-9.54 0.44,-9.51 ; 0.44,-9.525 1.56,-9.525 ; 0.44,-8.27 0.44,-8.24 ; 0.44,-8.255 1.56,-8.255 ; 0.44,-7 0.44,-6.97 ; 0.44,-6.985 1.56,-6.985 ; 0.44,-5.73 0.44,-5.7 ; 0.44,-5.715 1.56,-5.715 ; 0.44,-4.46 0.44,-4.43 ; 0.44,-4.445 1.56,-4.445 ; 0.44,-3.19 0.44,-3.16 ; 0.44,-3.175 1.56,-3.175 ; 0.44,-1.92 0.44,-1.89 ; 0.44,-1.905 1.56,-1.905 ; 0.76,-0.635 1.56,-0.635 ; 1.56,-20.58 5.56,-20.58 5.56,-20.06 1.56,-20.06 ; 1.56,-19.31 5.56,-19.31 5.56,-18.79 1.56,-18.79 ; 1.56,-18.04 5.56,-18.04 5.56,-17.52 1.56,-17.52 ; 1.56,-16.77 5.56,-16.77 5.56,-16.25 1.56,-16.25 ; 1.56,-15.5 5.56,-15.5 5.56,-14.98 1.56,-14.98 ; 1.56,-14.23 5.56,-14.23 5.56,-13.71 1.56,-13.71 ; 1.56,-12.96 5.56,-12.96 5.56,-12.44 1.56,-12.44 ; 1.56,-11.69 5.56,-11.69 5.56,-11.17 1.56,-11.17 ; 1.56,-10.42 5.56,-10.42 5.56,-9.9 1.56,-9.9 ; 1.56,-9.15 5.56,-9.15 5.56,-8.63 1.56,-8.63 ; 1.56,-7.88 5.56,-7.88 5.56,-7.36 1.56,-7.36 ; 1.56,-6.61 5.56,-6.61 5.56,-6.09 1.56,-6.09 ; 1.56,-5.34 5.56,-5.34 5.56,-4.82 1.56,-4.82 ; 1.56,-4.07 5.56,-4.07 5.56,-3.55 1.56,-3.55 ; 1.56,-2.8 5.56,-2.8 5.56,-2.28 1.56,-2.28 ; 1.56,-1.53 5.56,-1.53 5.56,-1.01 1.56,-1.01 ; 1.56,-0.26 5.56,-0.26 5.56,0.26 1.56,0.26 ; 1.56,-0.16 5.56,-0.16 ; 1.56,-0.04 5.56,-0.04 ; 1.56,0.08 5.56,0.08 ; 1.56,0.2 5.56,0.2
F.CrtYd:
  lines w0.05: -1.15,-21.5 -1.15,1.15 6,1.15 6,-21.5 -1.15,-21.5
F.Fab:
  lines w0.1: 0.5,-20.52 -0.2,-20.52 -0.2,-20.12 0.5,-20.12 ; 0.5,-19.25 -0.2,-19.25 -0.2,-18.85 0.5,-18.85 ; 0.5,-17.98 -0.2,-17.98 -0.2,-17.58 0.5,-17.58 ; 0.5,-16.71 -0.2,-16.71 -0.2,-16.31 0.5,-16.31 ; 0.5,-15.44 -0.2,-15.44 -0.2,-15.04 0.5,-15.04 ; 0.5,-14.17 -0.2,-14.17 -0.2,-13.77 0.5,-13.77 ; 0.5,-12.9 -0.2,-12.9 -0.2,-12.5 0.5,-12.5 ; 0.5,-11.63 -0.2,-11.63 -0.2,-11.23 0.5,-11.23 ; 0.5,-10.36 -0.2,-10.36 -0.2,-9.96 0.5,-9.96 ; 0.5,-9.09 -0.2,-9.09 -0.2,-8.69 0.5,-8.69 ; 0.5,-7.82 -0.2,-7.82 -0.2,-7.42 0.5,-7.42 ; 0.5,-6.55 -0.2,-6.55 -0.2,-6.15 0.5,-6.15 ; 0.5,-5.28 -0.2,-5.28 -0.2,-4.88 0.5,-4.88 ; 0.5,-4.01 -0.2,-4.01 -0.2,-3.61 0.5,-3.61 ; 0.5,-2.74 -0.2,-2.74 -0.2,-2.34 0.5,-2.34 ; 0.5,-1.47 -0.2,-1.47 -0.2,-1.07 0.5,-1.07 ; 0.5,-0.2 -0.2,-0.2 -0.2,0.2 0.5,0.2 ; 1.5,-20.52 5.5,-20.52 5.5,-20.12 1.5,-20.12 ; 1.5,-19.25 5.5,-19.25 5.5,-18.85 1.5,-18.85 ; 1.5,-17.98 5.5,-17.98 5.5,-17.58 1.5,-17.58 ; 1.5,-16.71 5.5,-16.71 5.5,-16.31 1.5,-16.31 ; 1.5,-15.44 5.5,-15.44 5.5,-15.04 1.5,-15.04 ; 1.5,-14.17 5.5,-14.17 5.5,-13.77 1.5,-13.77 ; 1.5,-12.9 5.5,-12.9 5.5,-12.5 1.5,-12.5 ; 1.5,-11.63 5.5,-11.63 5.5,-11.23 1.5,-11.23 ; 1.5,-10.36 5.5,-10.36 5.5,-9.96 1.5,-9.96 ; 1.5,-9.09 5.5,-9.09 5.5,-8.69 1.5,-8.69 ; 1.5,-7.82 5.5,-7.82 5.5,-7.42 1.5,-7.42 ; 1.5,-6.55 5.5,-6.55 5.5,-6.15 1.5,-6.15 ; 1.5,-5.28 5.5,-5.28 5.5,-4.88 1.5,-4.88 ; 1.5,-4.01 5.5,-4.01 5.5,-3.61 1.5,-3.61 ; 1.5,-2.74 5.5,-2.74 5.5,-2.34 1.5,-2.34 ; 1.5,-1.47 5.5,-1.47 5.5,-1.07 1.5,-1.07 ; 1.5,-0.2 5.5,-0.2 5.5,0.2 1.5,0.2 ; 0.5,-20.955 0.5,0.385 0.75,0.635 1.5,0.635 1.5,-20.955 0.5,-20.955
  text "'.Designator'" at 1.504,-12.588 h0.6

## PinHeader_1x17_P1.27mm_Vertical [mm]
pads (17):
  rect 1x1 hole 0.65: 1(0,0)
  rrect100% 1x1 hole 0.65: 2(0,-1.27) 3(0,-2.54) 4(0,-3.81) 5(0,-5.08) 6(0,-6.35) 7(0,-7.62) 8(0,-8.89) 9(0,-10.16) 10(0,-11.43) 11(0,-12.7) 12(0,-13.97) 13(0,-15.24) 14(0,-16.51) 15(0,-17.78) 16(0,-19.05) 17(0,-20.32)
F.SilkS:
  lines w0.12: -1.11,0 -1.11,0.76 0,0.76 ; -0.563,-0.76 -1.11,-0.76 -1.11,-21.015 -0.308,-21.015 ; 0.308,-21.015 1.11,-21.015 1.11,-0.76 0.563,-0.76
F.CrtYd:
  lines w0.05: -1.55,-21.5 1.55,-21.5 1.55,1.15 -1.55,1.15 -1.55,-21.5
F.Fab:
  lines w0.1: -1.05,-20.955 -1.05,0.11 -0.525,0.635 1.05,0.635 1.05,-20.955 -1.05,-20.955
  text "'.Designator'" at 0.84,-14.207 h1